# Altium schematic symbol library SCHLIB.SchLib: 2608 symbols (part 16 of 20)
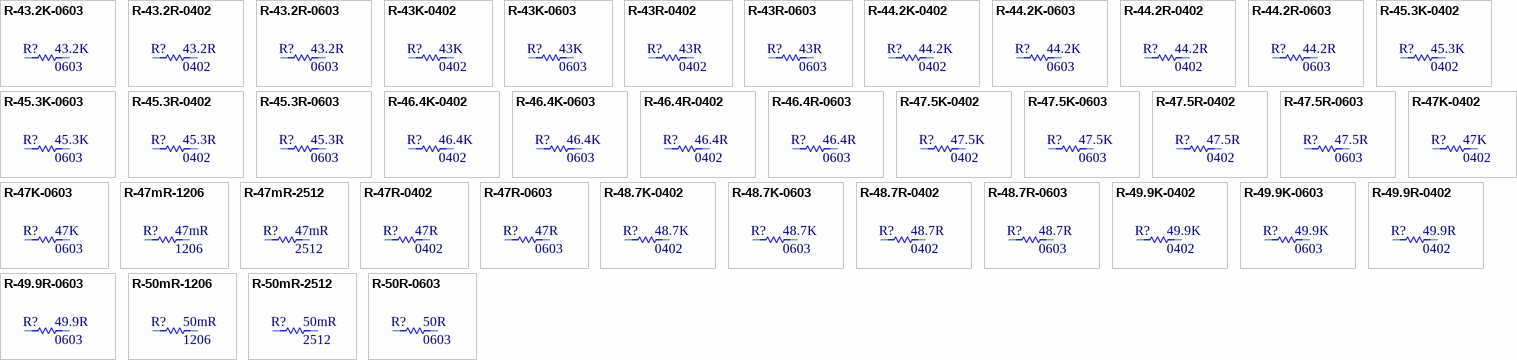
[diagram p98: symbols R-43.2K-0603 to R-50R-0603]

## R-47K-0603
designator R?, comment Package: 0603  (hidden comment: 47K)
RES SMD 47K OHM 1% 1/10W 0603; Manufacturer Part Number: CRCW060347K0FKEA; Manufacturer: Vishay Dale; Tolerance: 0.01; Power: 0.1W; Temperature Coefficient: ±100ppm/°C; Object  Type: Part; Design Item ID: R-47K-0603; Value: 47K; Composition: Thick Film; Features: Automotive AEC-Q200; Operating Temperature: -55°C ~ 155°C; Height - Seated (Max): 0.50mm; Category: Resistor
footprint R0603
pins: 1, 2

## R-47mR-1206
designator R?, comment Package: 1206  (hidden comment: 47mR)
RES 0.047 OHM 1% 1/4W 1206; Manufacturer Part Number: WSL1206R0470FEA; Manufacturer: Vishay Dale; Tolerance: 0.01; Power: 0.25W; Temperature Coefficient: ±75ppm/°C; Object  Type: Part; Design Item ID: R-47mR-1206; Value: 47mR; Composition: Metal Element; Features: Anti-Sulfur, Automotive AEC-Q200, Current Sense, Moisture Resistant, Pulse Withstanding; Operating Temperature: -65°C ~ 170°C; Height - Seated (Max): 0.89mm; Category: Resistor
footprint R1206
pins: 1, 2

## R-47mR-2512
designator R?, comment Package: 2512  (hidden comment: 47mR)
RES 0.047 OHM 1% 1W 2512; Manufacturer Part Number: WSL2512R0470FEA; Manufacturer: Vishay Dale; Tolerance: 0.01; Temperature Coefficient: ±75ppm/°C; Object  Type: Part; Design Item ID: R-47mR-2512; Value: 47mR; Power: 1W; Composition: Metal Element; Features: Anti-Sulfur, Automotive AEC-Q200, Current Sense, Moisture Resistant, Pulse Withstanding; Operating Temperature: -65°C ~ 170°C; Height - Seated (Max): 0.89mm; Category: Resistor
footprint R2512
pins: 1, 2

## R-47R-0402
designator R?, comment Package: 0402  (hidden comment: 47R)
RES 47 OHM 1% 1/16W 0402; Manufacturer Part Number: RC0402FR-0747RL; Manufacturer: YAGEO; Tolerance: 0.01; Power: 0.063W; Temperature Coefficient: ±100ppm/°C; Object  Type: Part; Design Item ID: R-47R-0402; Value: 47R; Composition: Thick Film; Features: Moisture Resistant; Operating Temperature: -55°C ~ 155°C; Height - Seated (Max): 0.40mm; Category: Resistor
footprint R0402
pins: 1, 2

## R-47R-0603
designator R?, comment Package: 0603  (hidden comment: 47R)
RES SMD 47 OHM 1% 1/10W 0603; Manufacturer Part Number: CRCW060347R0FKEA; Manufacturer: Vishay Dale; Tolerance: 0.01; Power: 0.1W; Temperature Coefficient: ±100ppm/°C; Object  Type: Part; Design Item ID: R-47R-0603; Value: 47R; Composition: Thick Film; Features: Automotive AEC-Q200; Operating Temperature: -55°C ~ 155°C; Height - Seated (Max): 0.50mm; Category: Resistor
footprint R0603
pins: 1, 2

## R-48.7K-0402
designator R?, comment Package: 0402  (hidden comment: 48.7K)
RES 48.7K OHM 1% 1/16W 0402; Manufacturer Part Number: RC0402FR-0748K7L; Manufacturer: YAGEO; Tolerance: 0.01; Power: 0.063W; Temperature Coefficient: ±100ppm/°C; Object  Type: Part; Design Item ID: R-48.7K-0402; Value: 48.7K; Composition: Thick Film; Features: Moisture Resistant; Operating Temperature: -55°C ~ 155°C; Height - Seated (Max): 0.40mm; Category: Resistor
footprint R0402
pins: 1, 2

## R-48.7K-0603
designator R?, comment Package: 0603  (hidden comment: 48.7K)
RES SMD 48.7K OHM 1% 1/10W 0603; Manufacturer Part Number: CRCW060348K7FKEA; Manufacturer: Vishay Dale; Tolerance: 0.01; Power: 0.1W; Temperature Coefficient: ±100ppm/°C; Object  Type: Part; Design Item ID: R-48.7K-0603; Value: 48.7K; Composition: Thick Film; Features: Automotive AEC-Q200; Operating Temperature: -55°C ~ 155°C; Height - Seated (Max): 0.50mm; Category: Resistor
footprint R0603
pins: 1, 2

## R-48.7R-0402
designator R?, comment Package: 0402  (hidden comment: 48.7R)
RES 48.7 OHM 1% 1/16W 0402; Manufacturer Part Number: RC0402FR-0748R7L; Manufacturer: YAGEO; Tolerance: 0.01; Power: 0.063W; Temperature Coefficient: ±100ppm/°C; Object  Type: Part; Design Item ID: R-48.7R-0402; Value: 48.7R; Composition: Thick Film; Features: Moisture Resistant; Operating Temperature: -55°C ~ 155°C; Height - Seated (Max): 0.40mm; Category: Resistor
footprint R0402
pins: 1, 2

## R-48.7R-0603
designator R?, comment Package: 0603  (hidden comment: 48.7R)
RES SMD 48.7 OHM 1% 1/10W 0603; Manufacturer Part Number: CRCW060348R7FKEA; Manufacturer: Vishay Dale; Tolerance: 0.01; Power: 0.1W; Temperature Coefficient: ±100ppm/°C; Object  Type: Part; Design Item ID: R-48.7R-0603; Value: 48.7R; Composition: Thick Film; Features: Automotive AEC-Q200; Operating Temperature: -55°C ~ 155°C; Height - Seated (Max): 0.50mm; Category: Resistor
footprint R0603
pins: 1, 2

## R-49.9K-0402
designator R?, comment Package: 0402  (hidden comment: 49.9K)
RES 49.9K OHM 1% 1/16W 0402; Manufacturer Part Number: RC0402FR-0749K9L; Manufacturer: YAGEO; Tolerance: 0.01; Power: 0.063W; Temperature Coefficient: ±100ppm/°C; Object  Type: Part; Design Item ID: R-49.9K-0402; Value: 49.9K; Composition: Thick Film; Features: Moisture Resistant; Operating Temperature: -55°C ~ 155°C; Height - Seated (Max): 0.40mm; Category: Resistor
footprint R0402
pins: 1, 2

## R-49.9K-0603
designator R?, comment Package: 0603  (hidden comment: 49.9K)
RES SMD 49.9K OHM 1% 1/10W 0603; Manufacturer Part Number: CRCW060349K9FKEA; Manufacturer: Vishay Dale; Tolerance: 0.01; Power: 0.1W; Temperature Coefficient: ±100ppm/°C; Object  Type: Part; Design Item ID: R-49.9K-0603; Value: 49.9K; Composition: Thick Film; Features: Automotive AEC-Q200; Operating Temperature: -55°C ~ 155°C; Height - Seated (Max): 0.50mm; Category: Resistor
footprint R0603
pins: 1, 2

## R-49.9R-0402
designator R?, comment Package: 0402  (hidden comment: 49.9R)
RES 49.9 OHM 1% 1/16W 0402; Manufacturer Part Number: RC0402FR-0749R9L; Manufacturer: YAGEO; Tolerance: 0.01; Power: 0.063W; Temperature Coefficient: ±100ppm/°C; Object  Type: Part; Design Item ID: R-49.9R-0402; Value: 49.9R; Composition: Thick Film; Features: Moisture Resistant; Operating Temperature: -55°C ~ 155°C; Height - Seated (Max): 0.40mm; Category: Resistor
footprint R0402
pins: 1, 2

## R-49.9R-0603
designator R?, comment Package: 0603  (hidden comment: 49.9R)
RES SMD 49.9 OHM 1% 1/10W 0603; Manufacturer Part Number: CRCW060349R9FKEA; Manufacturer: Vishay Dale; Tolerance: 0.01; Power: 0.1W; Temperature Coefficient: ±100ppm/°C; Object  Type: Part; Design Item ID: R-49.9R-0603; Value: 49.9R; Composition: Thick Film; Features: Automotive AEC-Q200; Operating Temperature: -55°C ~ 155°C; Height - Seated (Max): 0.50mm; Category: Resistor
footprint R0603
pins: 1, 2

## R-50mR-1206
designator R?, comment Package: 1206  (hidden comment: 50mR)
RES 0.05 OHM 1% 1/4W 1206; Manufacturer Part Number: WSL1206R0500FEA; Manufacturer: Vishay Dale; Tolerance: 0.01; Power: 0.25W; Temperature Coefficient: ±75ppm/°C; Object  Type: Part; Design Item ID: R-50mR-1206; Value: 50mR; Composition: Metal Element; Features: Anti-Sulfur, Automotive AEC-Q200, Current Sense, Moisture Resistant, Pulse Withstanding; Operating Temperature: -65°C ~ 170°C; Height - Seated (Max): 0.89mm; Category: Resistor
footprint R1206
pins: 1, 2

## R-50mR-2512
designator R?, comment Package: 2512  (hidden comment: 50mR)
RES 0.05 OHM 1% 1W 2512; Manufacturer Part Number: WSL2512R0500FEA; Manufacturer: Vishay Dale; Tolerance: 0.01; Temperature Coefficient: ±75ppm/°C; Object  Type: Part; Design Item ID: R-50mR-2512; Value: 50mR; Power: 1W; Composition: Metal Element; Features: Anti-Sulfur, Automotive AEC-Q200, Current Sense, Moisture Resistant, Pulse Withstanding; Operating Temperature: -65°C ~ 170°C; Height - Seated (Max): 0.89mm; Category: Resistor
footprint R2512
pins: 1, 2

## R-50R-0603
designator R?, comment Package: 0603  (hidden comment: 50R)
RES SMD 50 OHM 1% 1/10W 0603; Manufacturer Part Number: CRCW060350R0FKEA; Manufacturer: Vishay Dale; Tolerance: 0.01; Power: 0.1W; Temperature Coefficient: ±100ppm/°C; Object  Type: Part; Design Item ID: R-50R-0603; Value: 50R; Composition: Thick Film; Features: Automotive AEC-Q200; Operating Temperature: -55°C ~ 155°C; Height - Seated (Max): 0.50mm; Category: Resistor
footprint R0603
pins: 1, 2

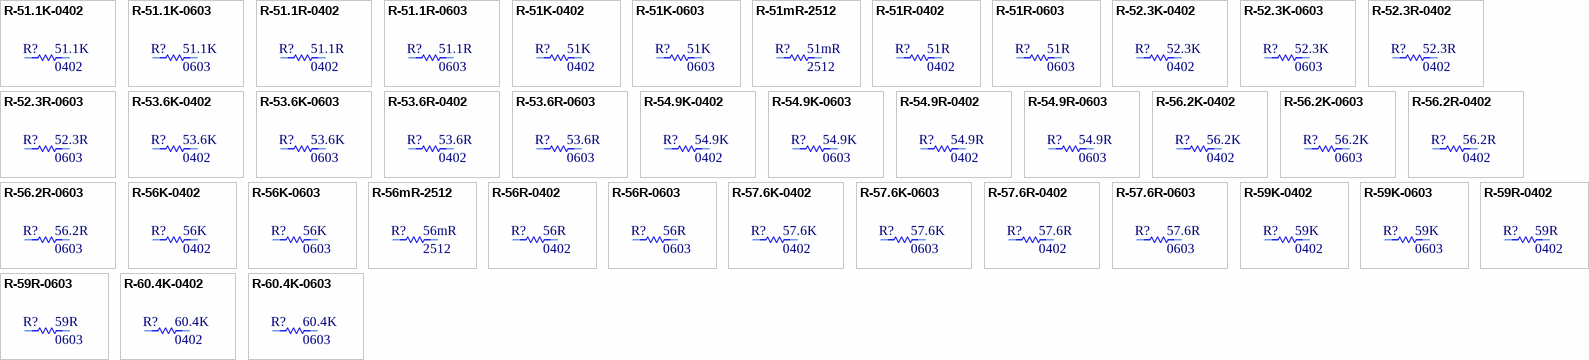
[diagram p66: symbols R-51.1K-0402 to R-60.4K-0603]

## R-51.1K-0402
designator R?, comment Package: 0402  (hidden comment: 51.1K)
RES 51.1K OHM 1% 1/16W 0402; Manufacturer Part Number: RC0402FR-0751K1L; Manufacturer: YAGEO; Tolerance: 0.01; Power: 0.063W; Temperature Coefficient: ±100ppm/°C; Object  Type: Part; Design Item ID: R-51.1K-0402; Value: 51.1K; Composition: Thick Film; Features: Moisture Resistant; Operating Temperature: -55°C ~ 155°C; Height - Seated (Max): 0.40mm; Category: Resistor
footprint R0402
pins: 1, 2

## R-51.1K-0603
designator R?, comment Package: 0603  (hidden comment: 51.1K)
RES SMD 51.1K OHM 1% 1/10W 0603; Manufacturer Part Number: CRCW060351K1FKEA; Manufacturer: Vishay Dale; Tolerance: 0.01; Power: 0.1W; Temperature Coefficient: ±100ppm/°C; Object  Type: Part; Design Item ID: R-51.1K-0603; Value: 51.1K; Composition: Thick Film; Features: Automotive AEC-Q200; Operating Temperature: -55°C ~ 155°C; Height - Seated (Max): 0.50mm; Category: Resistor
footprint R0603
pins: 1, 2

## R-51.1R-0402
designator R?, comment Package: 0402  (hidden comment: 51.1R)
RES 51.1 OHM 1% 1/16W 0402; Manufacturer Part Number: RC0402FR-0751R1L; Manufacturer: YAGEO; Tolerance: 0.01; Power: 0.063W; Temperature Coefficient: ±100ppm/°C; Object  Type: Part; Design Item ID: R-51.1R-0402; Value: 51.1R; Composition: Thick Film; Features: Moisture Resistant; Operating Temperature: -55°C ~ 155°C; Height - Seated (Max): 0.40mm; Category: Resistor
footprint R0402
pins: 1, 2

## R-51.1R-0603
designator R?, comment Package: 0603  (hidden comment: 51.1R)
RES SMD 51.1 OHM 1% 1/10W 0603; Manufacturer Part Number: CRCW060351R1FKEA; Manufacturer: Vishay Dale; Tolerance: 0.01; Power: 0.1W; Temperature Coefficient: ±100ppm/°C; Object  Type: Part; Design Item ID: R-51.1R-0603; Value: 51.1R; Composition: Thick Film; Features: Automotive AEC-Q200; Operating Temperature: -55°C ~ 155°C; Height - Seated (Max): 0.50mm; Category: Resistor
footprint R0603
pins: 1, 2

## R-51K-0402
designator R?, comment Package: 0402  (hidden comment: 51K)
RES 51K OHM 1% 1/16W 0402; Manufacturer Part Number: RC0402FR-0751KL; Manufacturer: YAGEO; Tolerance: 0.01; Power: 0.063W; Temperature Coefficient: ±100ppm/°C; Object  Type: Part; Design Item ID: R-51K-0402; Value: 51K; Composition: Thick Film; Features: Moisture Resistant; Operating Temperature: -55°C ~ 155°C; Height - Seated (Max): 0.40mm; Category: Resistor
footprint R0402
pins: 1, 2

## R-51K-0603
designator R?, comment Package: 0603  (hidden comment: 51K)
RES SMD 51K OHM 1% 1/10W 0603; Manufacturer Part Number: CRCW060351K0FKEA; Manufacturer: Vishay Dale; Tolerance: 0.01; Power: 0.1W; Temperature Coefficient: ±100ppm/°C; Object  Type: Part; Design Item ID: R-51K-0603; Value: 51K; Composition: Thick Film; Features: Automotive AEC-Q200; Operating Temperature: -55°C ~ 155°C; Height - Seated (Max): 0.50mm; Category: Resistor
footprint R0603
pins: 1, 2

## R-51mR-2512
designator R?, comment Package: 2512  (hidden comment: 51mR)
RES 0.051 OHM 1% 1W 2512; Manufacturer Part Number: WSL2512R0510FEA; Manufacturer: Vishay Dale; Tolerance: 0.01; Temperature Coefficient: ±75ppm/°C; Object  Type: Part; Design Item ID: R-51mR-2512; Value: 51mR; Power: 1W; Composition: Metal Element; Features: Anti-Sulfur, Automotive AEC-Q200, Current Sense, Moisture Resistant, Pulse Withstanding; Operating Temperature: -65°C ~ 170°C; Height - Seated (Max): 0.89mm; Category: Resistor
footprint R2512
pins: 1, 2

## R-51R-0402
designator R?, comment Package: 0402  (hidden comment: 51R)
RES 51 OHM 1% 1/16W 0402; Manufacturer Part Number: RC0402FR-0751RL; Manufacturer: YAGEO; Tolerance: 0.01; Power: 0.063W; Temperature Coefficient: ±100ppm/°C; Object  Type: Part; Design Item ID: R-51R-0402; Value: 51R; Composition: Thick Film; Features: Moisture Resistant; Operating Temperature: -55°C ~ 155°C; Height - Seated (Max): 0.40mm; Category: Resistor
footprint R0402
pins: 1, 2

## R-51R-0603
designator R?, comment Package: 0603  (hidden comment: 51R)
RES SMD 51 OHM 1% 1/10W 0603; Manufacturer Part Number: CRCW060351R0FKEA; Manufacturer: Vishay Dale; Tolerance: 0.01; Power: 0.1W; Temperature Coefficient: ±100ppm/°C; Object  Type: Part; Design Item ID: R-51R-0603; Value: 51R; Composition: Thick Film; Features: Automotive AEC-Q200; Operating Temperature: -55°C ~ 155°C; Height - Seated (Max): 0.50mm; Category: Resistor
footprint R0603
pins: 1, 2

## R-52.3K-0402
designator R?, comment Package: 0402  (hidden comment: 52.3K)
RES 52.3K OHM 1% 1/16W 0402; Manufacturer Part Number: RC0402FR-0752K3L; Manufacturer: YAGEO; Tolerance: 0.01; Power: 0.063W; Temperature Coefficient: ±100ppm/°C; Object  Type: Part; Design Item ID: R-52.3K-0402; Value: 52.3K; Composition: Thick Film; Features: Moisture Resistant; Operating Temperature: -55°C ~ 155°C; Height - Seated (Max): 0.40mm; Category: Resistor
footprint R0402
pins: 1, 2

## R-52.3K-0603
designator R?, comment Package: 0603  (hidden comment: 52.3K)
RES SMD 52.3K OHM 1% 1/10W 0603; Manufacturer Part Number: CRCW060352K3FKEA; Manufacturer: Vishay Dale; Tolerance: 0.01; Power: 0.1W; Temperature Coefficient: ±100ppm/°C; Object  Type: Part; Design Item ID: R-52.3K-0603; Value: 52.3K; Composition: Thick Film; Features: Automotive AEC-Q200; Operating Temperature: -55°C ~ 155°C; Height - Seated (Max): 0.50mm; Category: Resistor
footprint R0603
pins: 1, 2

## R-52.3R-0402
designator R?, comment Package: 0402  (hidden comment: 52.3R)
RES 52.3 OHM 1% 1/16W 0402; Manufacturer Part Number: RC0402FR-0752R3L; Manufacturer: YAGEO; Tolerance: 0.01; Power: 0.063W; Temperature Coefficient: ±100ppm/°C; Object  Type: Part; Design Item ID: R-52.3R-0402; Value: 52.3R; Composition: Thick Film; Features: Moisture Resistant; Operating Temperature: -55°C ~ 155°C; Height - Seated (Max): 0.40mm; Category: Resistor
footprint R0402
pins: 1, 2

## R-52.3R-0603
designator R?, comment Package: 0603  (hidden comment: 52.3R)
RES SMD 52.3 OHM 1% 1/10W 0603; Manufacturer Part Number: CRCW060352R3FKEA; Manufacturer: Vishay Dale; Tolerance: 0.01; Power: 0.1W; Temperature Coefficient: ±100ppm/°C; Object  Type: Part; Design Item ID: R-52.3R-0603; Value: 52.3R; Composition: Thick Film; Features: Automotive AEC-Q200; Operating Temperature: -55°C ~ 155°C; Height - Seated (Max): 0.50mm; Category: Resistor
footprint R0603
pins: 1, 2

## R-53.6K-0402
designator R?, comment Package: 0402  (hidden comment: 53.6K)
RES 53.6K OHM 1% 1/16W 0402; Manufacturer Part Number: RC0402FR-0753K6L; Manufacturer: YAGEO; Tolerance: 0.01; Power: 0.063W; Temperature Coefficient: ±100ppm/°C; Object  Type: Part; Design Item ID: R-53.6K-0402; Value: 53.6K; Composition: Thick Film; Features: Moisture Resistant; Operating Temperature: -55°C ~ 155°C; Height - Seated (Max): 0.40mm; Category: Resistor
footprint R0402
pins: 1, 2

## R-53.6K-0603
designator R?, comment Package: 0603  (hidden comment: 53.6K)
RES SMD 53.6K OHM 1% 1/10W 0603; Manufacturer Part Number: CRCW060353K6FKEA; Manufacturer: Vishay Dale; Tolerance: 0.01; Power: 0.1W; Temperature Coefficient: ±100ppm/°C; Object  Type: Part; Design Item ID: R-53.6K-0603; Value: 53.6K; Composition: Thick Film; Features: Automotive AEC-Q200; Operating Temperature: -55°C ~ 155°C; Height - Seated (Max): 0.50mm; Category: Resistor
footprint R0603
pins: 1, 2

## R-53.6R-0402
designator R?, comment Package: 0402  (hidden comment: 53.6R)
RES 53.6 OHM 1% 1/16W 0402; Manufacturer Part Number: RC0402FR-0753R6L; Manufacturer: YAGEO; Tolerance: 0.01; Power: 0.063W; Temperature Coefficient: ±100ppm/°C; Object  Type: Part; Design Item ID: R-53.6R-0402; Value: 53.6R; Composition: Thick Film; Features: Moisture Resistant; Operating Temperature: -55°C ~ 155°C; Height - Seated (Max): 0.40mm; Category: Resistor
footprint R0402
pins: 1, 2

## R-53.6R-0603
designator R?, comment Package: 0603  (hidden comment: 53.6R)
RES SMD 53.6 OHM 1% 1/10W 0603; Manufacturer Part Number: CRCW060353R6FKEA; Manufacturer: Vishay Dale; Tolerance: 0.01; Power: 0.1W; Temperature Coefficient: ±100ppm/°C; Object  Type: Part; Design Item ID: R-53.6R-0603; Value: 53.6R; Composition: Thick Film; Features: Automotive AEC-Q200; Operating Temperature: -55°C ~ 155°C; Height - Seated (Max): 0.50mm; Category: Resistor
footprint R0603
pins: 1, 2

## R-54.9K-0402
designator R?, comment Package: 0402  (hidden comment: 54.9K)
RES 54.9K OHM 1% 1/16W 0402; Manufacturer Part Number: RC0402FR-0754K9L; Manufacturer: YAGEO; Tolerance: 0.01; Power: 0.063W; Temperature Coefficient: ±100ppm/°C; Object  Type: Part; Design Item ID: R-54.9K-0402; Value: 54.9K; Composition: Thick Film; Features: Moisture Resistant; Operating Temperature: -55°C ~ 155°C; Height - Seated (Max): 0.40mm; Category: Resistor
footprint R0402
pins: 1, 2

## R-54.9K-0603
designator R?, comment Package: 0603  (hidden comment: 54.9K)
RES SMD 54.9K OHM 1% 1/10W 0603; Manufacturer Part Number: CRCW060354K9FKEA; Manufacturer: Vishay Dale; Tolerance: 0.01; Power: 0.1W; Temperature Coefficient: ±100ppm/°C; Object  Type: Part; Design Item ID: R-54.9K-0603; Value: 54.9K; Composition: Thick Film; Features: Automotive AEC-Q200; Operating Temperature: -55°C ~ 155°C; Height - Seated (Max): 0.50mm; Category: Resistor
footprint R0603
pins: 1, 2

## R-54.9R-0402
designator R?, comment Package: 0402  (hidden comment: 54.9R)
RES 54.9 OHM 1% 1/16W 0402; Manufacturer Part Number: RC0402FR-0754R9L; Manufacturer: YAGEO; Tolerance: 0.01; Power: 0.063W; Temperature Coefficient: ±100ppm/°C; Object  Type: Part; Design Item ID: R-54.9R-0402; Value: 54.9R; Composition: Thick Film; Features: Moisture Resistant; Operating Temperature: -55°C ~ 155°C; Height - Seated (Max): 0.40mm; Category: Resistor
footprint R0402
pins: 1, 2

## R-54.9R-0603
designator R?, comment Package: 0603  (hidden comment: 54.9R)
RES SMD 54.9 OHM 1% 1/10W 0603; Manufacturer Part Number: CRCW060354R9FKEA; Manufacturer: Vishay Dale; Tolerance: 0.01; Power: 0.1W; Temperature Coefficient: ±100ppm/°C; Object  Type: Part; Design Item ID: R-54.9R-0603; Value: 54.9R; Composition: Thick Film; Features: Automotive AEC-Q200; Operating Temperature: -55°C ~ 155°C; Height - Seated (Max): 0.50mm; Category: Resistor
footprint R0603
pins: 1, 2

## R-56.2K-0402
designator R?, comment Package: 0402  (hidden comment: 56.2K)
RES 56.2K OHM 1% 1/16W 0402; Manufacturer Part Number: RC0402FR-0756K2L; Manufacturer: YAGEO; Tolerance: 0.01; Power: 0.063W; Temperature Coefficient: ±100ppm/°C; Object  Type: Part; Design Item ID: R-56.2K-0402; Value: 56.2K; Composition: Thick Film; Features: Moisture Resistant; Operating Temperature: -55°C ~ 155°C; Height - Seated (Max): 0.40mm; Category: Resistor
footprint R0402
pins: 1, 2

## R-56.2K-0603
designator R?, comment Package: 0603  (hidden comment: 56.2K)
RES SMD 56.2K OHM 1% 1/10W 0603; Manufacturer Part Number: CRCW060356K2FKEA; Manufacturer: Vishay Dale; Tolerance: 0.01; Power: 0.1W; Temperature Coefficient: ±100ppm/°C; Object  Type: Part; Design Item ID: R-56.2K-0603; Value: 56.2K; Composition: Thick Film; Features: Automotive AEC-Q200; Operating Temperature: -55°C ~ 155°C; Height - Seated (Max): 0.50mm; Category: Resistor
footprint R0603
pins: 1, 2

## R-56.2R-0402
designator R?, comment Package: 0402  (hidden comment: 56.2R)
RES 56.2 OHM 1% 1/16W 0402; Manufacturer Part Number: RC0402FR-0756R2L; Manufacturer: YAGEO; Tolerance: 0.01; Power: 0.063W; Temperature Coefficient: ±100ppm/°C; Object  Type: Part; Design Item ID: R-56.2R-0402; Value: 56.2R; Composition: Thick Film; Features: Moisture Resistant; Operating Temperature: -55°C ~ 155°C; Height - Seated (Max): 0.40mm; Category: Resistor
footprint R0402
pins: 1, 2

## R-56.2R-0603
designator R?, comment Package: 0603  (hidden comment: 56.2R)
RES SMD 56.2 OHM 1% 1/10W 0603; Manufacturer Part Number: CRCW060356R2FKEA; Manufacturer: Vishay Dale; Tolerance: 0.01; Power: 0.1W; Temperature Coefficient: ±100ppm/°C; Object  Type: Part; Design Item ID: R-56.2R-0603; Value: 56.2R; Composition: Thick Film; Features: Automotive AEC-Q200; Operating Temperature: -55°C ~ 155°C; Height - Seated (Max): 0.50mm; Category: Resistor
footprint R0603
pins: 1, 2

## R-56K-0402
designator R?, comment Package: 0402  (hidden comment: 56K)
RES 56K OHM 1% 1/16W 0402; Manufacturer Part Number: RC0402FR-0756KL; Manufacturer: YAGEO; Tolerance: 0.01; Power: 0.063W; Temperature Coefficient: ±100ppm/°C; Object  Type: Part; Design Item ID: R-56K-0402; Value: 56K; Composition: Thick Film; Features: Moisture Resistant; Operating Temperature: -55°C ~ 155°C; Height - Seated (Max): 0.40mm; Category: Resistor
footprint R0402
pins: 1, 2

## R-56K-0603
designator R?, comment Package: 0603  (hidden comment: 56K)
RES SMD 56K OHM 1% 1/10W 0603; Manufacturer Part Number: CRCW060356K0FKEA; Manufacturer: Vishay Dale; Tolerance: 0.01; Power: 0.1W; Temperature Coefficient: ±100ppm/°C; Object  Type: Part; Design Item ID: R-56K-0603; Value: 56K; Composition: Thick Film; Features: Automotive AEC-Q200; Operating Temperature: -55°C ~ 155°C; Height - Seated (Max): 0.50mm; Category: Resistor
footprint R0603
pins: 1, 2

## R-56mR-2512
designator R?, comment Package: 2512  (hidden comment: 56mR)
RES 0.056 OHM 1% 1W 2512; Manufacturer Part Number: WSL2512R0560FEA; Manufacturer: Vishay Dale; Tolerance: 0.01; Temperature Coefficient: ±75ppm/°C; Object  Type: Part; Design Item ID: R-56mR-2512; Value: 56mR; Power: 1W; Composition: Metal Element; Features: Anti-Sulfur, Automotive AEC-Q200, Current Sense, Moisture Resistant, Pulse Withstanding; Operating Temperature: -65°C ~ 170°C; Height - Seated (Max): 0.89mm; Category: Resistor
footprint R2512
pins: 1, 2

## R-56R-0402
designator R?, comment Package: 0402  (hidden comment: 56R)
RES 56 OHM 1% 1/16W 0402; Manufacturer Part Number: RC0402FR-0756RL; Manufacturer: YAGEO; Tolerance: 0.01; Power: 0.063W; Temperature Coefficient: ±100ppm/°C; Object  Type: Part; Design Item ID: R-56R-0402; Value: 56R; Composition: Thick Film; Features: Moisture Resistant; Operating Temperature: -55°C ~ 155°C; Height - Seated (Max): 0.40mm; Category: Resistor
footprint R0402
pins: 1, 2

## R-56R-0603
designator R?, comment Package: 0603  (hidden comment: 56R)
RES SMD 56 OHM 1% 1/10W 0603; Manufacturer Part Number: CRCW060356R0FKEA; Manufacturer: Vishay Dale; Tolerance: 0.01; Power: 0.1W; Temperature Coefficient: ±100ppm/°C; Object  Type: Part; Design Item ID: R-56R-0603; Value: 56R; Composition: Thick Film; Features: Automotive AEC-Q200; Operating Temperature: -55°C ~ 155°C; Height - Seated (Max): 0.50mm; Category: Resistor
footprint R0603
pins: 1, 2

## R-57.6K-0402
designator R?, comment Package: 0402  (hidden comment: 57.6K)
RES 57.6K OHM 1% 1/16W 0402; Manufacturer Part Number: RC0402FR-0757K6L; Manufacturer: YAGEO; Tolerance: 0.01; Power: 0.063W; Temperature Coefficient: ±100ppm/°C; Object  Type: Part; Design Item ID: R-57.6K-0402; Value: 57.6K; Composition: Thick Film; Features: Moisture Resistant; Operating Temperature: -55°C ~ 155°C; Height - Seated (Max): 0.40mm; Category: Resistor
footprint R0402
pins: 1, 2

## R-57.6K-0603
designator R?, comment Package: 0603  (hidden comment: 57.6K)
RES SMD 57.6K OHM 1% 1/10W 0603; Manufacturer Part Number: CRCW060357K6FKEA; Manufacturer: Vishay Dale; Tolerance: 0.01; Power: 0.1W; Temperature Coefficient: ±100ppm/°C; Object  Type: Part; Design Item ID: R-57.6K-0603; Value: 57.6K; Composition: Thick Film; Features: Automotive AEC-Q200; Operating Temperature: -55°C ~ 155°C; Height - Seated (Max): 0.50mm; Category: Resistor
footprint R0603
pins: 1, 2

## R-57.6R-0402
designator R?, comment Package: 0402  (hidden comment: 57.6R)
RES 57.6 OHM 1% 1/16W 0402; Manufacturer Part Number: RC0402FR-0757R6L; Manufacturer: YAGEO; Tolerance: 0.01; Power: 0.063W; Temperature Coefficient: ±100ppm/°C; Object  Type: Part; Design Item ID: R-57.6R-0402; Value: 57.6R; Composition: Thick Film; Features: Moisture Resistant; Operating Temperature: -55°C ~ 155°C; Height - Seated (Max): 0.40mm; Category: Resistor
footprint R0402
pins: 1, 2

## R-57.6R-0603
designator R?, comment Package: 0603  (hidden comment: 57.6R)
RES SMD 57.6 OHM 1% 1/10W 0603; Manufacturer Part Number: CRCW060357R6FKEA; Manufacturer: Vishay Dale; Tolerance: 0.01; Power: 0.1W; Temperature Coefficient: ±100ppm/°C; Object  Type: Part; Design Item ID: R-57.6R-0603; Value: 57.6R; Composition: Thick Film; Features: Automotive AEC-Q200; Operating Temperature: -55°C ~ 155°C; Height - Seated (Max): 0.50mm; Category: Resistor
footprint R0603
pins: 1, 2

## R-59K-0402
designator R?, comment Package: 0402  (hidden comment: 59K)
RES 59K OHM 1% 1/16W 0402; Manufacturer Part Number: RC0402FR-0759KL; Manufacturer: YAGEO; Tolerance: 0.01; Power: 0.063W; Temperature Coefficient: ±100ppm/°C; Object  Type: Part; Design Item ID: R-59K-0402; Value: 59K; Composition: Thick Film; Features: Moisture Resistant; Operating Temperature: -55°C ~ 155°C; Height - Seated (Max): 0.40mm; Category: Resistor
footprint R0402
pins: 1, 2

## R-59K-0603
designator R?, comment Package: 0603  (hidden comment: 59K)
RES SMD 59K OHM 1% 1/10W 0603; Manufacturer Part Number: CRCW060359K0FKEA; Manufacturer: Vishay Dale; Tolerance: 0.01; Power: 0.1W; Temperature Coefficient: ±100ppm/°C; Object  Type: Part; Design Item ID: R-59K-0603; Value: 59K; Composition: Thick Film; Features: Automotive AEC-Q200; Operating Temperature: -55°C ~ 155°C; Height - Seated (Max): 0.50mm; Category: Resistor
footprint R0603
pins: 1, 2

## R-59R-0402
designator R?, comment Package: 0402  (hidden comment: 59R)
RES 59 OHM 1% 1/16W 0402; Manufacturer Part Number: RC0402FR-0759RL; Manufacturer: YAGEO; Tolerance: 0.01; Power: 0.063W; Temperature Coefficient: ±100ppm/°C; Object  Type: Part; Design Item ID: R-59R-0402; Value: 59R; Composition: Thick Film; Features: Moisture Resistant; Operating Temperature: -55°C ~ 155°C; Height - Seated (Max): 0.40mm; Category: Resistor
footprint R0402
pins: 1, 2

## R-59R-0603
designator R?, comment Package: 0603  (hidden comment: 59R)
RES SMD 59 OHM 1% 1/10W 0603; Manufacturer Part Number: CRCW060359R0FKEA; Manufacturer: Vishay Dale; Tolerance: 0.01; Power: 0.1W; Temperature Coefficient: ±100ppm/°C; Object  Type: Part; Design Item ID: R-59R-0603; Value: 59R; Composition: Thick Film; Features: Automotive AEC-Q200; Operating Temperature: -55°C ~ 155°C; Height - Seated (Max): 0.50mm; Category: Resistor
footprint R0603
pins: 1, 2

## R-60.4K-0402
designator R?, comment Package: 0402  (hidden comment: 60.4K)
RES 60.4K OHM 1% 1/16W 0402; Manufacturer Part Number: RC0402FR-0760K4L; Manufacturer: YAGEO; Tolerance: 0.01; Power: 0.063W; Temperature Coefficient: ±100ppm/°C; Object  Type: Part; Design Item ID: R-60.4K-0402; Value: 60.4K; Composition: Thick Film; Features: Moisture Resistant; Operating Temperature: -55°C ~ 155°C; Height - Seated (Max): 0.40mm; Category: Resistor
footprint R0402
pins: 1, 2

## R-60.4K-0603
designator R?, comment Package: 0603  (hidden comment: 60.4K)
RES SMD 60.4K OHM 1% 1/10W 0603; Manufacturer Part Number: CRCW060360K4FKEA; Manufacturer: Vishay Dale; Tolerance: 0.01; Power: 0.1W; Temperature Coefficient: ±100ppm/°C; Object  Type: Part; Design Item ID: R-60.4K-0603; Value: 60.4K; Composition: Thick Film; Features: Automotive AEC-Q200; Operating Temperature: -55°C ~ 155°C; Height - Seated (Max): 0.50mm; Category: Resistor
footprint R0603
pins: 1, 2

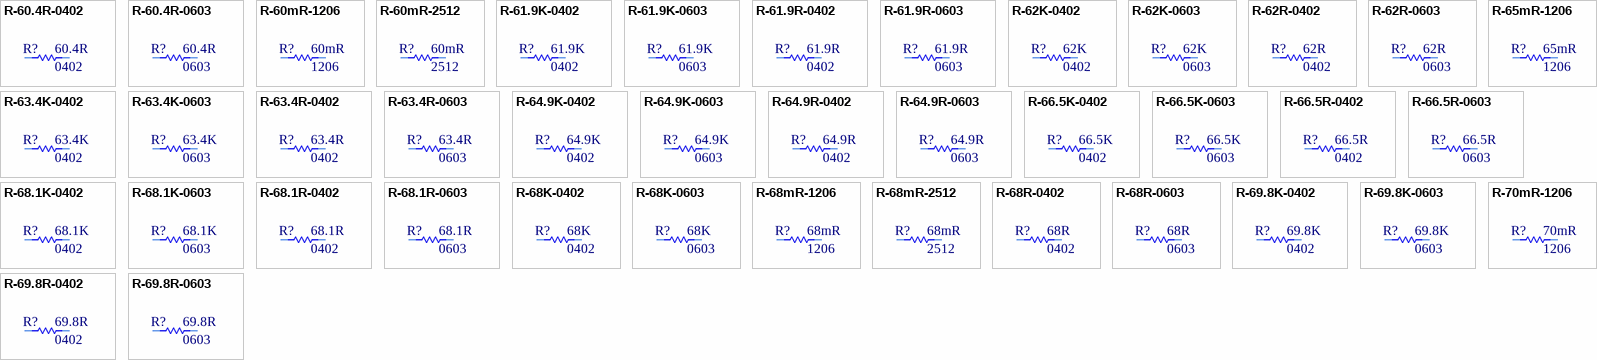
[diagram p67: symbols R-60.4R-0402 to R-70mR-1206]

## R-60.4R-0402
designator R?, comment Package: 0402  (hidden comment: 60.4R)
RES 60.4 OHM 1% 1/16W 0402; Manufacturer Part Number: RC0402FR-0760R4L; Manufacturer: YAGEO; Tolerance: 0.01; Power: 0.063W; Temperature Coefficient: ±100ppm/°C; Object  Type: Part; Design Item ID: R-60.4R-0402; Value: 60.4R; Composition: Thick Film; Features: Moisture Resistant; Operating Temperature: -55°C ~ 155°C; Height - Seated (Max): 0.40mm; Category: Resistor
footprint R0402
pins: 1, 2

## R-60.4R-0603
designator R?, comment Package: 0603  (hidden comment: 60.4R)
RES SMD 60.4 OHM 1% 1/10W 0603; Manufacturer Part Number: CRCW060360R4FKEA; Manufacturer: Vishay Dale; Tolerance: 0.01; Power: 0.1W; Temperature Coefficient: ±100ppm/°C; Object  Type: Part; Design Item ID: R-60.4R-0603; Value: 60.4R; Composition: Thick Film; Features: Automotive AEC-Q200; Operating Temperature: -55°C ~ 155°C; Height - Seated (Max): 0.50mm; Category: Resistor
footprint R0603
pins: 1, 2

## R-60mR-1206
designator R?, comment Package: 1206  (hidden comment: 60mR)
RES 0.06 OHM 1% 1/4W 1206; Manufacturer Part Number: WSL1206R0600FEA; Manufacturer: Vishay Dale; Tolerance: 0.01; Power: 0.25W; Temperature Coefficient: ±75ppm/°C; Object  Type: Part; Design Item ID: R-60mR-1206; Value: 60mR; Composition: Metal Element; Features: Anti-Sulfur, Automotive AEC-Q200, Current Sense, Moisture Resistant, Pulse Withstanding; Operating Temperature: -65°C ~ 170°C; Height - Seated (Max): 0.89mm; Category: Resistor
footprint R1206
pins: 1, 2

## R-60mR-2512
designator R?, comment Package: 2512  (hidden comment: 60mR)
RES 0.06 OHM 1% 1W 2512; Manufacturer Part Number: WSL2512R0600FEA; Manufacturer: Vishay Dale; Tolerance: 0.01; Temperature Coefficient: ±75ppm/°C; Object  Type: Part; Design Item ID: R-60mR-2512; Value: 60mR; Power: 1W; Composition: Metal Element; Features: Anti-Sulfur, Automotive AEC-Q200, Current Sense, Moisture Resistant, Pulse Withstanding; Operating Temperature: -65°C ~ 170°C; Height - Seated (Max): 0.89mm; Category: Resistor
footprint R2512
pins: 1, 2

## R-61.9K-0402
designator R?, comment Package: 0402  (hidden comment: 61.9K)
RES 61.9K OHM 1% 1/16W 0402; Manufacturer Part Number: RC0402FR-0761K9L; Manufacturer: YAGEO; Tolerance: 0.01; Power: 0.063W; Temperature Coefficient: ±100ppm/°C; Object  Type: Part; Design Item ID: R-61.9K-0402; Value: 61.9K; Composition: Thick Film; Features: Moisture Resistant; Operating Temperature: -55°C ~ 155°C; Height - Seated (Max): 0.40mm; Category: Resistor
footprint R0402
pins: 1, 2

## R-61.9K-0603
designator R?, comment Package: 0603  (hidden comment: 61.9K)
RES SMD 61.9K OHM 1% 1/10W 0603; Manufacturer Part Number: CRCW060361K9FKEA; Manufacturer: Vishay Dale; Tolerance: 0.01; Power: 0.1W; Temperature Coefficient: ±100ppm/°C; Object  Type: Part; Design Item ID: R-61.9K-0603; Value: 61.9K; Composition: Thick Film; Features: Automotive AEC-Q200; Operating Temperature: -55°C ~ 155°C; Height - Seated (Max): 0.50mm; Category: Resistor
footprint R0603
pins: 1, 2

## R-61.9R-0402
designator R?, comment Package: 0402  (hidden comment: 61.9R)
RES 61.9 OHM 1% 1/16W 0402; Manufacturer Part Number: RC0402FR-0761R9L; Manufacturer: YAGEO; Tolerance: 0.01; Power: 0.063W; Temperature Coefficient: ±100ppm/°C; Object  Type: Part; Design Item ID: R-61.9R-0402; Value: 61.9R; Composition: Thick Film; Features: Moisture Resistant; Operating Temperature: -55°C ~ 155°C; Height - Seated (Max): 0.40mm; Category: Resistor
footprint R0402
pins: 1, 2

## R-61.9R-0603
designator R?, comment Package: 0603  (hidden comment: 61.9R)
RES SMD 61.9 OHM 1% 1/10W 0603; Manufacturer Part Number: CRCW060361R9FKEA; Manufacturer: Vishay Dale; Tolerance: 0.01; Power: 0.1W; Temperature Coefficient: ±100ppm/°C; Object  Type: Part; Design Item ID: R-61.9R-0603; Value: 61.9R; Composition: Thick Film; Features: Automotive AEC-Q200; Operating Temperature: -55°C ~ 155°C; Height - Seated (Max): 0.50mm; Category: Resistor
footprint R0603
pins: 1, 2

## R-62K-0402
designator R?, comment Package: 0402  (hidden comment: 62K)
RES 62K OHM 1% 1/16W 0402; Manufacturer Part Number: RC0402FR-0762KL; Manufacturer: YAGEO; Tolerance: 0.01; Power: 0.063W; Temperature Coefficient: ±100ppm/°C; Object  Type: Part; Design Item ID: R-62K-0402; Value: 62K; Composition: Thick Film; Features: Moisture Resistant; Operating Temperature: -55°C ~ 155°C; Height - Seated (Max): 0.40mm; Category: Resistor
footprint R0402
pins: 1, 2

## R-62K-0603
designator R?, comment Package: 0603  (hidden comment: 62K)
RES SMD 62K OHM 1% 1/10W 0603; Manufacturer Part Number: CRCW060362K0FKEA; Manufacturer: Vishay Dale; Tolerance: 0.01; Power: 0.1W; Temperature Coefficient: ±100ppm/°C; Object  Type: Part; Design Item ID: R-62K-0603; Value: 62K; Composition: Thick Film; Features: Automotive AEC-Q200; Operating Temperature: -55°C ~ 155°C; Height - Seated (Max): 0.50mm; Category: Resistor
footprint R0603
pins: 1, 2

## R-62R-0402
designator R?, comment Package: 0402  (hidden comment: 62R)
RES 62 OHM 1% 1/16W 0402; Manufacturer Part Number: RC0402FR-0762RL; Manufacturer: YAGEO; Tolerance: 0.01; Power: 0.063W; Temperature Coefficient: ±100ppm/°C; Object  Type: Part; Design Item ID: R-62R-0402; Value: 62R; Composition: Thick Film; Features: Moisture Resistant; Operating Temperature: -55°C ~ 155°C; Height - Seated (Max): 0.40mm; Category: Resistor
footprint R0402
pins: 1, 2

## R-62R-0603
designator R?, comment Package: 0603  (hidden comment: 62R)
RES SMD 62 OHM 1% 1/10W 0603; Manufacturer Part Number: CRCW060362R0FKEA; Manufacturer: Vishay Dale; Tolerance: 0.01; Power: 0.1W; Temperature Coefficient: ±100ppm/°C; Object  Type: Part; Design Item ID: R-62R-0603; Value: 62R; Composition: Thick Film; Features: Automotive AEC-Q200; Operating Temperature: -55°C ~ 155°C; Height - Seated (Max): 0.50mm; Category: Resistor
footprint R0603
pins: 1, 2

## R-63.4K-0402
designator R?, comment Package: 0402  (hidden comment: 63.4K)
RES 63.4K OHM 1% 1/16W 0402; Manufacturer Part Number: RC0402FR-0763K4L; Manufacturer: YAGEO; Tolerance: 0.01; Power: 0.063W; Temperature Coefficient: ±100ppm/°C; Object  Type: Part; Design Item ID: R-63.4K-0402; Value: 63.4K; Composition: Thick Film; Features: Moisture Resistant; Operating Temperature: -55°C ~ 155°C; Height - Seated (Max): 0.40mm; Category: Resistor
footprint R0402
pins: 1, 2

## R-63.4K-0603
designator R?, comment Package: 0603  (hidden comment: 63.4K)
RES SMD 63.4K OHM 1% 1/10W 0603; Manufacturer Part Number: CRCW060363K4FKEA; Manufacturer: Vishay Dale; Tolerance: 0.01; Power: 0.1W; Temperature Coefficient: ±100ppm/°C; Object  Type: Part; Design Item ID: R-63.4K-0603; Value: 63.4K; Composition: Thick Film; Features: Automotive AEC-Q200; Operating Temperature: -55°C ~ 155°C; Height - Seated (Max): 0.50mm; Category: Resistor
footprint R0603
pins: 1, 2

## R-63.4R-0402
designator R?, comment Package: 0402  (hidden comment: 63.4R)
RES 63.4 OHM 1% 1/16W 0402; Manufacturer Part Number: RC0402FR-0763R4L; Manufacturer: YAGEO; Tolerance: 0.01; Power: 0.063W; Temperature Coefficient: ±100ppm/°C; Object  Type: Part; Design Item ID: R-63.4R-0402; Value: 63.4R; Composition: Thick Film; Features: Moisture Resistant; Operating Temperature: -55°C ~ 155°C; Height - Seated (Max): 0.40mm; Category: Resistor
footprint R0402
pins: 1, 2

## R-63.4R-0603
designator R?, comment Package: 0603  (hidden comment: 63.4R)
RES SMD 63.4 OHM 1% 1/10W 0603; Manufacturer Part Number: CRCW060363R4FKEA; Manufacturer: Vishay Dale; Tolerance: 0.01; Power: 0.1W; Temperature Coefficient: ±100ppm/°C; Object  Type: Part; Design Item ID: R-63.4R-0603; Value: 63.4R; Composition: Thick Film; Features: Automotive AEC-Q200; Operating Temperature: -55°C ~ 155°C; Height - Seated (Max): 0.50mm; Category: Resistor
footprint R0603
pins: 1, 2

## R-64.9K-0402
designator R?, comment Package: 0402  (hidden comment: 64.9K)
RES 64.9K OHM 1% 1/16W 0402; Manufacturer Part Number: RC0402FR-0764K9L; Manufacturer: YAGEO; Tolerance: 0.01; Power: 0.063W; Temperature Coefficient: ±100ppm/°C; Object  Type: Part; Design Item ID: R-64.9K-0402; Value: 64.9K; Composition: Thick Film; Features: Moisture Resistant; Operating Temperature: -55°C ~ 155°C; Height - Seated (Max): 0.40mm; Category: Resistor
footprint R0402
pins: 1, 2

## R-64.9K-0603
designator R?, comment Package: 0603  (hidden comment: 64.9K)
RES SMD 64.9K OHM 1% 1/10W 0603; Manufacturer Part Number: CRCW060364K9FKEA; Manufacturer: Vishay Dale; Tolerance: 0.01; Power: 0.1W; Temperature Coefficient: ±100ppm/°C; Object  Type: Part; Design Item ID: R-64.9K-0603; Value: 64.9K; Composition: Thick Film; Features: Automotive AEC-Q200; Operating Temperature: -55°C ~ 155°C; Height - Seated (Max): 0.50mm; Category: Resistor
footprint R0603
pins: 1, 2

## R-64.9R-0402
designator R?, comment Package: 0402  (hidden comment: 64.9R)
RES 64.9 OHM 1% 1/16W 0402; Manufacturer Part Number: RC0402FR-0764R9L; Manufacturer: YAGEO; Tolerance: 0.01; Power: 0.063W; Temperature Coefficient: ±100ppm/°C; Object  Type: Part; Design Item ID: R-64.9R-0402; Value: 64.9R; Composition: Thick Film; Features: Moisture Resistant; Operating Temperature: -55°C ~ 155°C; Height - Seated (Max): 0.40mm; Category: Resistor
footprint R0402
pins: 1, 2

## R-64.9R-0603
designator R?, comment Package: 0603  (hidden comment: 64.9R)
RES SMD 64.9 OHM 1% 1/10W 0603; Manufacturer Part Number: CRCW060364R9FKEA; Manufacturer: Vishay Dale; Tolerance: 0.01; Power: 0.1W; Temperature Coefficient: ±100ppm/°C; Object  Type: Part; Design Item ID: R-64.9R-0603; Value: 64.9R; Composition: Thick Film; Features: Automotive AEC-Q200; Operating Temperature: -55°C ~ 155°C; Height - Seated (Max): 0.50mm; Category: Resistor
footprint R0603
pins: 1, 2

## R-65mR-1206
designator R?, comment Package: 1206  (hidden comment: 65mR)
RES 0.065 OHM 1% 1/4W 1206; Manufacturer Part Number: WSL1206R0650FEA; Manufacturer: Vishay Dale; Tolerance: 0.01; Power: 0.25W; Temperature Coefficient: ±75ppm/°C; Object  Type: Part; Design Item ID: R-65mR-1206; Value: 65mR; Composition: Metal Element; Features: Anti-Sulfur, Automotive AEC-Q200, Current Sense, Moisture Resistant, Pulse Withstanding; Operating Temperature: -65°C ~ 170°C; Height - Seated (Max): 0.89mm; Category: Resistor
footprint R1206
pins: 1, 2

## R-66.5K-0402
designator R?, comment Package: 0402  (hidden comment: 66.5K)
RES 66.5K OHM 1% 1/16W 0402; Manufacturer Part Number: RC0402FR-0766K5L; Manufacturer: YAGEO; Tolerance: 0.01; Power: 0.063W; Temperature Coefficient: ±100ppm/°C; Object  Type: Part; Design Item ID: R-66.5K-0402; Value: 66.5K; Composition: Thick Film; Features: Moisture Resistant; Operating Temperature: -55°C ~ 155°C; Height - Seated (Max): 0.40mm; Category: Resistor
footprint R0402
pins: 1, 2

## R-66.5K-0603
designator R?, comment Package: 0603  (hidden comment: 66.5K)
RES SMD 66.5K OHM 1% 1/10W 0603; Manufacturer Part Number: CRCW060366K5FKEA; Manufacturer: Vishay Dale; Tolerance: 0.01; Power: 0.1W; Temperature Coefficient: ±100ppm/°C; Object  Type: Part; Design Item ID: R-66.5K-0603; Value: 66.5K; Composition: Thick Film; Features: Automotive AEC-Q200; Operating Temperature: -55°C ~ 155°C; Height - Seated (Max): 0.50mm; Category: Resistor
footprint R0603
pins: 1, 2

## R-66.5R-0402
designator R?, comment Package: 0402  (hidden comment: 66.5R)
RES 66.5 OHM 1% 1/16W 0402; Manufacturer Part Number: RC0402FR-0766R5L; Manufacturer: YAGEO; Tolerance: 0.01; Power: 0.063W; Temperature Coefficient: ±100ppm/°C; Object  Type: Part; Design Item ID: R-66.5R-0402; Value: 66.5R; Composition: Thick Film; Features: Moisture Resistant; Operating Temperature: -55°C ~ 155°C; Height - Seated (Max): 0.40mm; Category: Resistor
footprint R0402
pins: 1, 2

## R-66.5R-0603
designator R?, comment Package: 0603  (hidden comment: 66.5R)
RES SMD 66.5 OHM 1% 1/10W 0603; Manufacturer Part Number: CRCW060366R5FKEA; Manufacturer: Vishay Dale; Tolerance: 0.01; Power: 0.1W; Temperature Coefficient: ±100ppm/°C; Object  Type: Part; Design Item ID: R-66.5R-0603; Value: 66.5R; Composition: Thick Film; Features: Automotive AEC-Q200; Operating Temperature: -55°C ~ 155°C; Height - Seated (Max): 0.50mm; Category: Resistor
footprint R0603
pins: 1, 2

## R-68.1K-0402
designator R?, comment Package: 0402  (hidden comment: 68.1K)
RES 68.1K OHM 1% 1/16W 0402; Manufacturer Part Number: RC0402FR-0768K1L; Manufacturer: YAGEO; Tolerance: 0.01; Power: 0.063W; Temperature Coefficient: ±100ppm/°C; Object  Type: Part; Design Item ID: R-68.1K-0402; Value: 68.1K; Composition: Thick Film; Features: Moisture Resistant; Operating Temperature: -55°C ~ 155°C; Height - Seated (Max): 0.40mm; Category: Resistor
footprint R0402
pins: 1, 2

## R-68.1K-0603
designator R?, comment Package: 0603  (hidden comment: 68.1K)
RES SMD 68.1K OHM 1% 1/10W 0603; Manufacturer Part Number: CRCW060368K1FKEA; Manufacturer: Vishay Dale; Tolerance: 0.01; Power: 0.1W; Temperature Coefficient: ±100ppm/°C; Object  Type: Part; Design Item ID: R-68.1K-0603; Value: 68.1K; Composition: Thick Film; Features: Automotive AEC-Q200; Operating Temperature: -55°C ~ 155°C; Height - Seated (Max): 0.50mm; Category: Resistor
footprint R0603
pins: 1, 2

## R-68.1R-0402
designator R?, comment Package: 0402  (hidden comment: 68.1R)